# Altium footprint library Package_DIP.PcbLib: 236 footprints (part 7 of 15)
Each footprint in its own frame and in the unit in brackets; x right, y up, seen from the top. Pads: shape width x height; smd on the part's side, far side on the other; paste and mask are expansions set on the pad; w line width, h text height; cw(c..) or ccw(c..) is an arc to the next point about the centre after c.
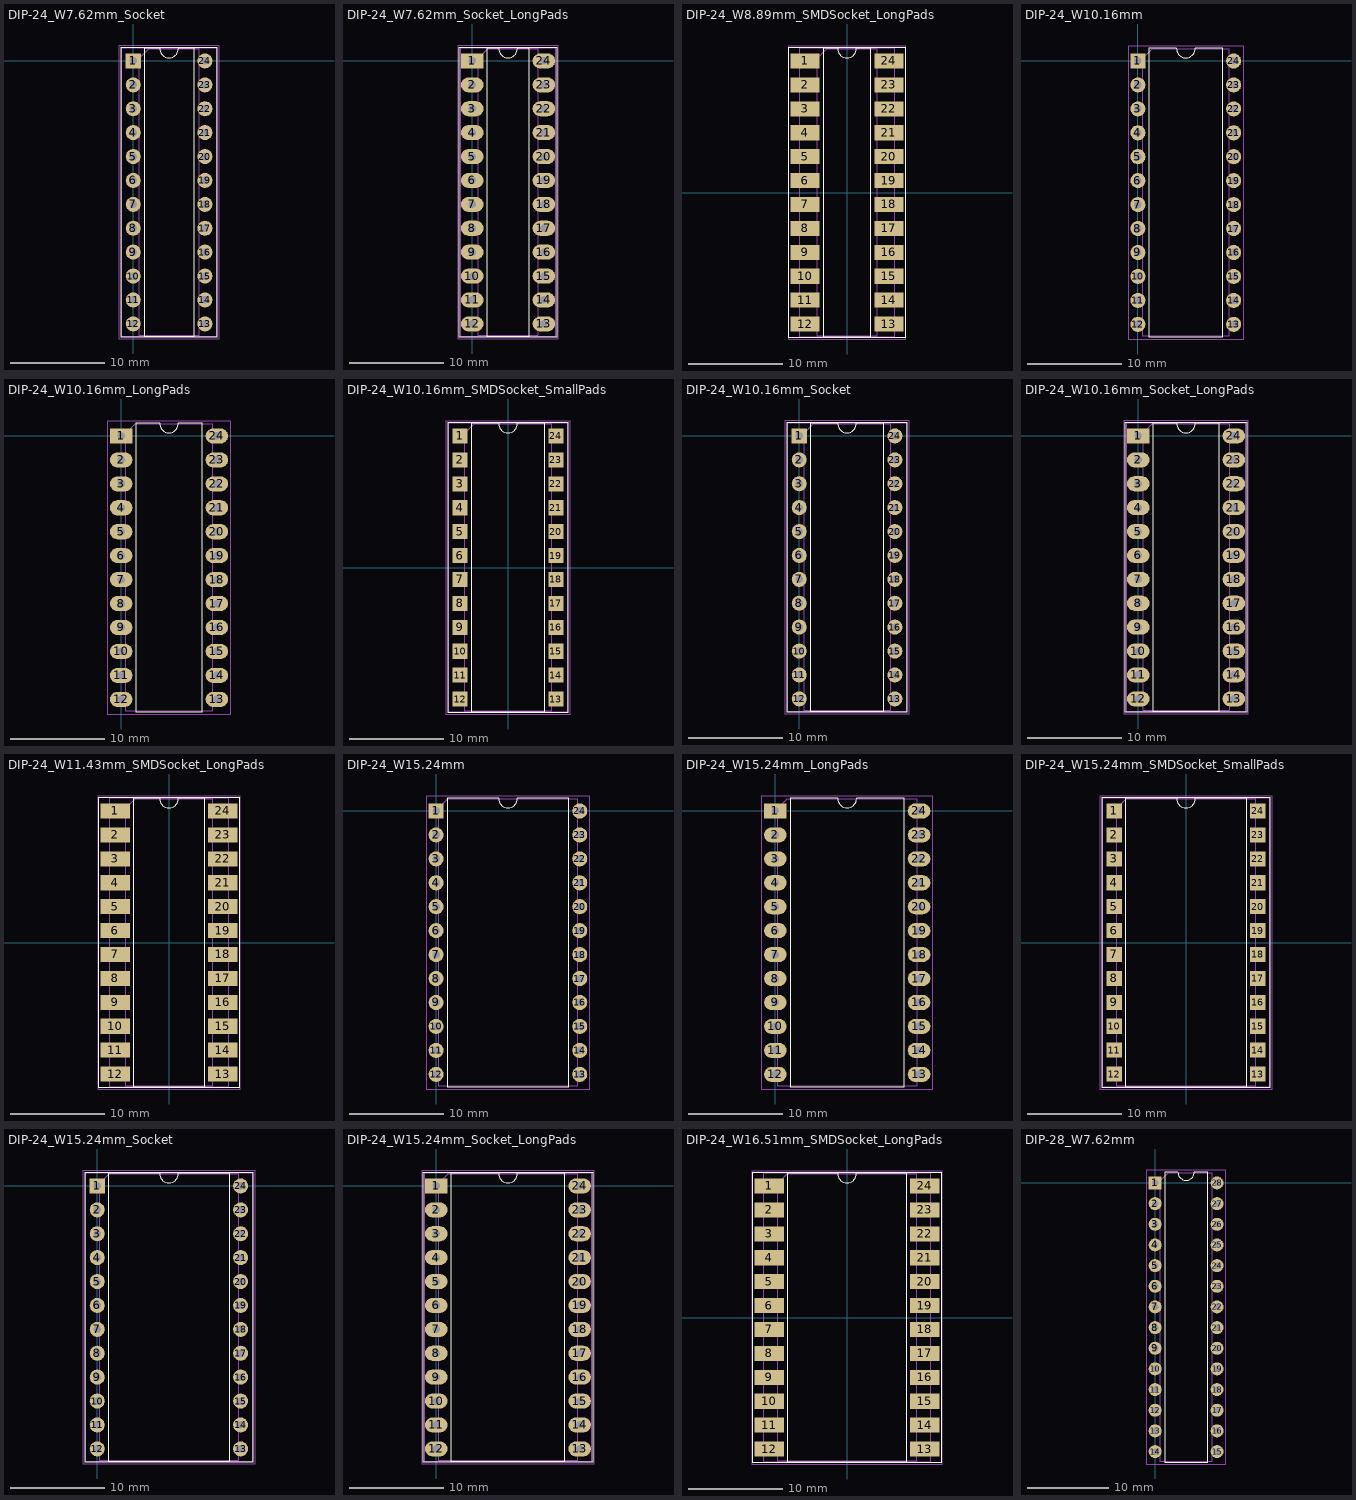
[diagram p6: the footprints below, top view; thin cyan lines are the x and y axes]

## DIP-24_W7.62mm_Socket [mm]
pads (24):
  rect 1.6x1.6 hole 0.8: 1(0,0)
  rrect100% 1.6x1.6 hole 0.8: 2(0,-2.54) 3(0,-5.08) 4(0,-7.62) 5(0,-10.16) 6(0,-12.7) 7(0,-15.24) 8(0,-17.78) 9(0,-20.32) 10(0,-22.86) 11(0,-25.4) 12(0,-27.94) 13(7.62,-27.94) 14(7.62,-25.4) 15(7.62,-22.86) 16(7.62,-20.32) 17(7.62,-17.78) 18(7.62,-15.24) 19(7.62,-12.7) 20(7.62,-10.16) 21(7.62,-7.62) 22(7.62,-5.08) 23(7.62,-2.54) 24(7.62,0)
F.SilkS:
  lines w0.12: -1.33,-29.33 -1.33,1.39 8.95,1.39 8.95,-29.33 -1.33,-29.33 ; 1.16,-29.27 1.16,1.33 2.81,1.33 ccw(c3.81,1.33) 4.81,1.33 6.46,1.33 6.46,-29.27 1.16,-29.27
F.CrtYd:
  lines w0.05: -1.55,-29.55 -1.55,1.6 9.15,1.6 9.15,-29.55 -1.55,-29.55
F.Fab:
  lines w0.1: -1.27,-29.27 8.89,-29.27 8.89,1.33 -1.27,1.33 -1.27,-29.27 ; 0.635,-29.21 0.635,0.27 1.635,1.27 6.985,1.27 6.985,-29.21 0.635,-29.21
  text "'.Designator'" at -0.237,-14.81 h1

## DIP-24_W7.62mm_Socket_LongPads [mm]
pads (24):
  rect 2.4x1.6 hole 0.8: 1(0,0)
  rrect100% 2.4x1.6 hole 0.8: 2(0,-2.54) 3(0,-5.08) 4(0,-7.62) 5(0,-10.16) 6(0,-12.7) 7(0,-15.24) 8(0,-17.78) 9(0,-20.32) 10(0,-22.86) 11(0,-25.4) 12(0,-27.94) 13(7.62,-27.94) 14(7.62,-25.4) 15(7.62,-22.86) 16(7.62,-20.32) 17(7.62,-17.78) 18(7.62,-15.24) 19(7.62,-12.7) 20(7.62,-10.16) 21(7.62,-7.62) 22(7.62,-5.08) 23(7.62,-2.54) 24(7.62,0)
F.SilkS:
  lines w0.12: -1.44,-29.33 9.06,-29.33 9.06,1.39 -1.44,1.39 -1.44,-29.33 ; 1.56,-29.27 6.06,-29.27 6.06,1.33 4.81,1.33 cw(c3.81,1.33) 2.81,1.33 1.56,1.33 1.56,-29.27
F.CrtYd:
  lines w0.05: -1.55,-29.55 -1.55,1.6 9.15,1.6 9.15,-29.55 -1.55,-29.55
F.Fab:
  lines w0.1: -1.27,-29.27 -1.27,1.33 8.89,1.33 8.89,-29.27 -1.27,-29.27 ; 0.635,-29.21 0.635,0.27 1.635,1.27 6.985,1.27 6.985,-29.21 0.635,-29.21
  text "'.Designator'" at -0.237,-14.81 h1

## DIP-24_W8.89mm_SMDSocket_LongPads [mm]
pads (24):
  rect 3.1x1.6 smd: 1(-4.445,13.97) 2(-4.445,11.43) 3(-4.445,8.89) 4(-4.445,6.35) 5(-4.445,3.81) 6(-4.445,1.27) 7(-4.445,-1.27) 8(-4.445,-3.81) 9(-4.445,-6.35) 10(-4.445,-8.89) 11(-4.445,-11.43) 12(-4.445,-13.97) 13(4.445,-13.97) 14(4.445,-11.43) 15(4.445,-8.89) 16(4.445,-6.35) 17(4.445,-3.81) 18(4.445,-1.27) 19(4.445,1.27) 20(4.445,3.81) 21(4.445,6.35) 22(4.445,8.89) 23(4.445,11.43) 24(4.445,13.97)
F.SilkS:
  lines w0.12: -6.235,-15.36 6.235,-15.36 6.235,15.36 -6.235,15.36 -6.235,-15.36 ; -2.535,-15.3 -2.535,15.3 -1,15.3 ccw(c0,15.3) 1,15.3 2.535,15.3 2.535,-15.3 -2.535,-15.3
F.CrtYd:
  lines w0.05: -6.25,-15.55 -6.25,15.55 6.25,15.55 6.25,-15.55 -6.25,-15.55
F.Fab:
  lines w0.1: -5.08,-15.3 5.08,-15.3 5.08,15.3 -5.08,15.3 -5.08,-15.3 ; -3.175,-15.24 -3.175,14.24 -2.175,15.24 3.175,15.24 3.175,-15.24 -3.175,-15.24
  text "'.Designator'" at -4.047,-0.84 h1

## DIP-24_W10.16mm [mm]
pads (24):
  rect 1.6x1.6 hole 0.8: 1(0,0)
  rrect100% 1.6x1.6 hole 0.8: 2(0,-2.54) 3(0,-5.08) 4(0,-7.62) 5(0,-10.16) 6(0,-12.7) 7(0,-15.24) 8(0,-17.78) 9(0,-20.32) 10(0,-22.86) 11(0,-25.4) 12(0,-27.94) 13(10.16,-27.94) 14(10.16,-25.4) 15(10.16,-22.86) 16(10.16,-20.32) 17(10.16,-17.78) 18(10.16,-15.24) 19(10.16,-12.7) 20(10.16,-10.16) 21(10.16,-7.62) 22(10.16,-5.08) 23(10.16,-2.54) 24(10.16,0)
F.SilkS:
  lines w0.12: 1.16,-29.27 9,-29.27 9,1.33 6.08,1.33 cw(c5.08,1.33) 4.08,1.33 1.16,1.33 1.16,-29.27
F.CrtYd:
  lines w0.05: -1.05,-29.5 -1.05,1.55 11.25,1.55 11.25,-29.5 -1.05,-29.5
F.Fab:
  lines w0.1: 0.51,-29.21 9.65,-29.21 9.65,1.27 1.51,1.27 0.51,0.27 0.51,-29.21
  text "'.Designator'" at 1.033,-14.81 h1

## DIP-24_W10.16mm_LongPads [mm]
pads (24):
  rect 2.4x1.6 hole 0.8: 1(0,0)
  rrect100% 2.4x1.6 hole 0.8: 2(0,-2.54) 3(0,-5.08) 4(0,-7.62) 5(0,-10.16) 6(0,-12.7) 7(0,-15.24) 8(0,-17.78) 9(0,-20.32) 10(0,-22.86) 11(0,-25.4) 12(0,-27.94) 13(10.16,-27.94) 14(10.16,-25.4) 15(10.16,-22.86) 16(10.16,-20.32) 17(10.16,-17.78) 18(10.16,-15.24) 19(10.16,-12.7) 20(10.16,-10.16) 21(10.16,-7.62) 22(10.16,-5.08) 23(10.16,-2.54) 24(10.16,0)
F.SilkS:
  lines w0.12: 1.56,-29.27 8.6,-29.27 8.6,1.33 6.08,1.33 cw(c5.08,1.33) 4.08,1.33 1.56,1.33 1.56,-29.27
F.CrtYd:
  lines w0.05: -1.5,-29.5 -1.5,1.55 11.65,1.55 11.65,-29.5 -1.5,-29.5
F.Fab:
  lines w0.1: 0.51,-29.21 9.65,-29.21 9.65,1.27 1.51,1.27 0.51,0.27 0.51,-29.21
  text "'.Designator'" at 1.033,-14.81 h1

## DIP-24_W10.16mm_SMDSocket_SmallPads [mm]
pads (24):
  rect 1.6x1.6 smd: 1(-5.08,13.97) 2(-5.08,11.43) 3(-5.08,8.89) 4(-5.08,6.35) 5(-5.08,3.81) 6(-5.08,1.27) 7(-5.08,-1.27) 8(-5.08,-3.81) 9(-5.08,-6.35) 10(-5.08,-8.89) 11(-5.08,-11.43) 12(-5.08,-13.97) 13(5.08,-13.97) 14(5.08,-11.43) 15(5.08,-8.89) 16(5.08,-6.35) 17(5.08,-3.81) 18(5.08,-1.27) 19(5.08,1.27) 20(5.08,3.81) 21(5.08,6.35) 22(5.08,8.89) 23(5.08,11.43) 24(5.08,13.97)
F.SilkS:
  lines w0.12: -6.41,-15.36 -6.41,15.36 6.41,15.36 6.41,-15.36 -6.41,-15.36 ; -3.92,-15.3 -3.92,15.3 -1,15.3 ccw(c0,15.3) 1,15.3 3.92,15.3 3.92,-15.3 -3.92,-15.3
F.CrtYd:
  lines w0.05: -6.6,-15.55 6.6,-15.55 6.6,15.55 -6.6,15.55 -6.6,-15.55
F.Fab:
  lines w0.1: -6.35,-15.3 -6.35,15.3 6.35,15.3 6.35,-15.3 -6.35,-15.3 ; -4.57,-15.24 -4.57,14.24 -3.57,15.24 4.57,15.24 4.57,-15.24 -4.57,-15.24
  text "'.Designator'" at -4.047,-0.84 h1

## DIP-24_W10.16mm_Socket [mm]
pads (24):
  rect 1.6x1.6 hole 0.8: 1(0,0)
  rrect100% 1.6x1.6 hole 0.8: 2(0,-2.54) 3(0,-5.08) 4(0,-7.62) 5(0,-10.16) 6(0,-12.7) 7(0,-15.24) 8(0,-17.78) 9(0,-20.32) 10(0,-22.86) 11(0,-25.4) 12(0,-27.94) 13(10.16,-27.94) 14(10.16,-25.4) 15(10.16,-22.86) 16(10.16,-20.32) 17(10.16,-17.78) 18(10.16,-15.24) 19(10.16,-12.7) 20(10.16,-10.16) 21(10.16,-7.62) 22(10.16,-5.08) 23(10.16,-2.54) 24(10.16,0)
F.SilkS:
  lines w0.12: -1.33,-29.33 11.49,-29.33 11.49,1.39 -1.33,1.39 -1.33,-29.33 ; 1.16,-29.27 1.16,1.33 4.08,1.33 ccw(c5.08,1.33) 6.08,1.33 9,1.33 9,-29.27 1.16,-29.27
F.CrtYd:
  lines w0.05: -1.55,-29.55 11.7,-29.55 11.7,1.6 -1.55,1.6 -1.55,-29.55
F.Fab:
  lines w0.1: -1.27,-29.27 11.43,-29.27 11.43,1.33 -1.27,1.33 -1.27,-29.27 ; 0.51,-29.21 9.65,-29.21 9.65,1.27 1.51,1.27 0.51,0.27 0.51,-29.21
  text "'.Designator'" at 1.033,-14.81 h1

## DIP-24_W10.16mm_Socket_LongPads [mm]
pads (24):
  rect 2.4x1.6 hole 0.8: 1(0,0)
  rrect100% 2.4x1.6 hole 0.8: 2(0,-2.54) 3(0,-5.08) 4(0,-7.62) 5(0,-10.16) 6(0,-12.7) 7(0,-15.24) 8(0,-17.78) 9(0,-20.32) 10(0,-22.86) 11(0,-25.4) 12(0,-27.94) 13(10.16,-27.94) 14(10.16,-25.4) 15(10.16,-22.86) 16(10.16,-20.32) 17(10.16,-17.78) 18(10.16,-15.24) 19(10.16,-12.7) 20(10.16,-10.16) 21(10.16,-7.62) 22(10.16,-5.08) 23(10.16,-2.54) 24(10.16,0)
F.SilkS:
  lines w0.12: -1.44,-29.33 11.6,-29.33 11.6,1.39 -1.44,1.39 -1.44,-29.33 ; 1.56,-29.27 8.6,-29.27 8.6,1.33 6.08,1.33 cw(c5.08,1.33) 4.08,1.33 1.56,1.33 1.56,-29.27
F.CrtYd:
  lines w0.05: -1.55,-29.55 11.7,-29.55 11.7,1.6 -1.55,1.6 -1.55,-29.55
F.Fab:
  lines w0.1: -1.27,-29.27 11.43,-29.27 11.43,1.33 -1.27,1.33 -1.27,-29.27 ; 0.51,-29.21 9.65,-29.21 9.65,1.27 1.51,1.27 0.51,0.27 0.51,-29.21
  text "'.Designator'" at 1.033,-14.81 h1

## DIP-24_W11.43mm_SMDSocket_LongPads [mm]
pads (24):
  rect 3.1x1.6 smd: 1(-5.715,13.97) 2(-5.715,11.43) 3(-5.715,8.89) 4(-5.715,6.35) 5(-5.715,3.81) 6(-5.715,1.27) 7(-5.715,-1.27) 8(-5.715,-3.81) 9(-5.715,-6.35) 10(-5.715,-8.89) 11(-5.715,-11.43) 12(-5.715,-13.97) 13(5.715,-13.97) 14(5.715,-11.43) 15(5.715,-8.89) 16(5.715,-6.35) 17(5.715,-3.81) 18(5.715,-1.27) 19(5.715,1.27) 20(5.715,3.81) 21(5.715,6.35) 22(5.715,8.89) 23(5.715,11.43) 24(5.715,13.97)
F.SilkS:
  lines w0.12: -7.505,-15.36 -7.505,15.36 7.505,15.36 7.505,-15.36 -7.505,-15.36 ; -3.805,-15.3 3.805,-15.3 3.805,15.3 1,15.3 cw(c0,15.3) -1,15.3 -3.805,15.3 -3.805,-15.3
F.CrtYd:
  lines w0.05: -7.55,-15.55 -7.55,15.55 7.55,15.55 7.55,-15.55 -7.55,-15.55
F.Fab:
  lines w0.1: -6.35,-15.3 -6.35,15.3 6.35,15.3 6.35,-15.3 -6.35,-15.3 ; -4.57,-15.24 -4.57,14.24 -3.57,15.24 4.57,15.24 4.57,-15.24 -4.57,-15.24
  text "'.Designator'" at -4.047,-0.84 h1

## DIP-24_W15.24mm [mm]
pads (24):
  rect 1.6x1.6 hole 0.8: 1(0,0)
  rrect100% 1.6x1.6 hole 0.8: 2(0,-2.54) 3(0,-5.08) 4(0,-7.62) 5(0,-10.16) 6(0,-12.7) 7(0,-15.24) 8(0,-17.78) 9(0,-20.32) 10(0,-22.86) 11(0,-25.4) 12(0,-27.94) 13(15.24,-27.94) 14(15.24,-25.4) 15(15.24,-22.86) 16(15.24,-20.32) 17(15.24,-17.78) 18(15.24,-15.24) 19(15.24,-12.7) 20(15.24,-10.16) 21(15.24,-7.62) 22(15.24,-5.08) 23(15.24,-2.54) 24(15.24,0)
F.SilkS:
  lines w0.12: 1.16,-29.27 14.08,-29.27 14.08,1.33 8.62,1.33 cw(c7.62,1.33) 6.62,1.33 1.16,1.33 1.16,-29.27
F.CrtYd:
  lines w0.05: -1.05,-29.5 -1.05,1.55 16.3,1.55 16.3,-29.5 -1.05,-29.5
F.Fab:
  lines w0.1: 0.255,-29.21 14.985,-29.21 14.985,1.27 1.255,1.27 0.255,0.27 0.255,-29.21
  text "'.Designator'" at 3.573,-14.81 h1

## DIP-24_W15.24mm_LongPads [mm]
pads (24):
  rect 2.4x1.6 hole 0.8: 1(0,0)
  rrect100% 2.4x1.6 hole 0.8: 2(0,-2.54) 3(0,-5.08) 4(0,-7.62) 5(0,-10.16) 6(0,-12.7) 7(0,-15.24) 8(0,-17.78) 9(0,-20.32) 10(0,-22.86) 11(0,-25.4) 12(0,-27.94) 13(15.24,-27.94) 14(15.24,-25.4) 15(15.24,-22.86) 16(15.24,-20.32) 17(15.24,-17.78) 18(15.24,-15.24) 19(15.24,-12.7) 20(15.24,-10.16) 21(15.24,-7.62) 22(15.24,-5.08) 23(15.24,-2.54) 24(15.24,0)
F.SilkS:
  lines w0.12: 1.56,-29.27 1.56,1.33 6.62,1.33 ccw(c7.62,1.33) 8.62,1.33 13.68,1.33 13.68,-29.27 1.56,-29.27
F.CrtYd:
  lines w0.05: -1.5,-29.5 16.7,-29.5 16.7,1.55 -1.5,1.55 -1.5,-29.5
F.Fab:
  lines w0.1: 0.255,-29.21 0.255,0.27 1.255,1.27 14.985,1.27 14.985,-29.21 0.255,-29.21
  text "'.Designator'" at 3.573,-14.81 h1

## DIP-24_W15.24mm_SMDSocket_SmallPads [mm]
pads (24):
  rect 1.6x1.6 smd: 1(-7.62,13.97) 2(-7.62,11.43) 3(-7.62,8.89) 4(-7.62,6.35) 5(-7.62,3.81) 6(-7.62,1.27) 7(-7.62,-1.27) 8(-7.62,-3.81) 9(-7.62,-6.35) 10(-7.62,-8.89) 11(-7.62,-11.43) 12(-7.62,-13.97) 13(7.62,-13.97) 14(7.62,-11.43) 15(7.62,-8.89) 16(7.62,-6.35) 17(7.62,-3.81) 18(7.62,-1.27) 19(7.62,1.27) 20(7.62,3.81) 21(7.62,6.35) 22(7.62,8.89) 23(7.62,11.43) 24(7.62,13.97)
F.SilkS:
  lines w0.12: -8.95,-15.36 8.95,-15.36 8.95,15.36 -8.95,15.36 -8.95,-15.36 ; -6.46,-15.3 6.46,-15.3 6.46,15.3 1,15.3 cw(c0,15.3) -1,15.3 -6.46,15.3 -6.46,-15.3
F.CrtYd:
  lines w0.05: -9.15,-15.55 9.15,-15.55 9.15,15.55 -9.15,15.55 -9.15,-15.55
F.Fab:
  lines w0.1: -8.89,-15.3 -8.89,15.3 8.89,15.3 8.89,-15.3 -8.89,-15.3 ; -7.365,-15.24 -7.365,14.24 -6.365,15.24 7.365,15.24 7.365,-15.24 -7.365,-15.24
  text "'.Designator'" at -4.047,-0.84 h1

## DIP-24_W15.24mm_Socket [mm]
pads (24):
  rect 1.6x1.6 hole 0.8: 1(0,0)
  rrect100% 1.6x1.6 hole 0.8: 2(0,-2.54) 3(0,-5.08) 4(0,-7.62) 5(0,-10.16) 6(0,-12.7) 7(0,-15.24) 8(0,-17.78) 9(0,-20.32) 10(0,-22.86) 11(0,-25.4) 12(0,-27.94) 13(15.24,-27.94) 14(15.24,-25.4) 15(15.24,-22.86) 16(15.24,-20.32) 17(15.24,-17.78) 18(15.24,-15.24) 19(15.24,-12.7) 20(15.24,-10.16) 21(15.24,-7.62) 22(15.24,-5.08) 23(15.24,-2.54) 24(15.24,0)
F.SilkS:
  lines w0.12: -1.33,-29.33 -1.33,1.39 16.57,1.39 16.57,-29.33 -1.33,-29.33 ; 1.16,-29.27 1.16,1.33 6.62,1.33 ccw(c7.62,1.33) 8.62,1.33 14.08,1.33 14.08,-29.27 1.16,-29.27
F.CrtYd:
  lines w0.05: -1.55,-29.55 -1.55,1.6 16.8,1.6 16.8,-29.55 -1.55,-29.55
F.Fab:
  lines w0.1: -1.27,-29.27 16.51,-29.27 16.51,1.33 -1.27,1.33 -1.27,-29.27 ; 0.255,-29.21 0.255,0.27 1.255,1.27 14.985,1.27 14.985,-29.21 0.255,-29.21
  text "'.Designator'" at 3.573,-14.81 h1

## DIP-24_W15.24mm_Socket_LongPads [mm]
pads (24):
  rect 2.4x1.6 hole 0.8: 1(0,0)
  rrect100% 2.4x1.6 hole 0.8: 2(0,-2.54) 3(0,-5.08) 4(0,-7.62) 5(0,-10.16) 6(0,-12.7) 7(0,-15.24) 8(0,-17.78) 9(0,-20.32) 10(0,-22.86) 11(0,-25.4) 12(0,-27.94) 13(15.24,-27.94) 14(15.24,-25.4) 15(15.24,-22.86) 16(15.24,-20.32) 17(15.24,-17.78) 18(15.24,-15.24) 19(15.24,-12.7) 20(15.24,-10.16) 21(15.24,-7.62) 22(15.24,-5.08) 23(15.24,-2.54) 24(15.24,0)
F.SilkS:
  lines w0.12: -1.44,-29.33 -1.44,1.39 16.68,1.39 16.68,-29.33 -1.44,-29.33 ; 1.56,-29.27 13.68,-29.27 13.68,1.33 8.62,1.33 cw(c7.62,1.33) 6.62,1.33 1.56,1.33 1.56,-29.27
F.CrtYd:
  lines w0.05: -1.55,-29.55 16.8,-29.55 16.8,1.6 -1.55,1.6 -1.55,-29.55
F.Fab:
  lines w0.1: -1.27,-29.27 16.51,-29.27 16.51,1.33 -1.27,1.33 -1.27,-29.27 ; 0.255,-29.21 0.255,0.27 1.255,1.27 14.985,1.27 14.985,-29.21 0.255,-29.21
  text "'.Designator'" at 3.573,-14.81 h1

## DIP-24_W16.51mm_SMDSocket_LongPads [mm]
pads (24):
  rect 3.1x1.6 smd: 1(-8.255,13.97) 2(-8.255,11.43) 3(-8.255,8.89) 4(-8.255,6.35) 5(-8.255,3.81) 6(-8.255,1.27) 7(-8.255,-1.27) 8(-8.255,-3.81) 9(-8.255,-6.35) 10(-8.255,-8.89) 11(-8.255,-11.43) 12(-8.255,-13.97) 13(8.255,-13.97) 14(8.255,-11.43) 15(8.255,-8.89) 16(8.255,-6.35) 17(8.255,-3.81) 18(8.255,-1.27) 19(8.255,1.27) 20(8.255,3.81) 21(8.255,6.35) 22(8.255,8.89) 23(8.255,11.43) 24(8.255,13.97)
F.SilkS:
  lines w0.12: -10.045,-15.36 10.045,-15.36 10.045,15.36 -10.045,15.36 -10.045,-15.36 ; -6.345,-15.3 -6.345,15.3 -1,15.3 ccw(c0,15.3) 1,15.3 6.345,15.3 6.345,-15.3 -6.345,-15.3
F.CrtYd:
  lines w0.05: -10.1,-15.55 10.1,-15.55 10.1,15.55 -10.1,15.55 -10.1,-15.55
F.Fab:
  lines w0.1: -8.89,-15.3 -8.89,15.3 8.89,15.3 8.89,-15.3 -8.89,-15.3 ; -7.365,-15.24 7.365,-15.24 7.365,15.24 -6.365,15.24 -7.365,14.24 -7.365,-15.24
  text "'.Designator'" at -4.047,-0.84 h1

## DIP-28_W7.62mm [mm]
pads (28):
  rect 1.6x1.6 hole 0.8: 1(0,0)
  rrect100% 1.6x1.6 hole 0.8: 2(0,-2.54) 3(0,-5.08) 4(0,-7.62) 5(0,-10.16) 6(0,-12.7) 7(0,-15.24) 8(0,-17.78) 9(0,-20.32) 10(0,-22.86) 11(0,-25.4) 12(0,-27.94) 13(0,-30.48) 14(0,-33.02) 15(7.62,-33.02) 16(7.62,-30.48) 17(7.62,-27.94) 18(7.62,-25.4) 19(7.62,-22.86) 20(7.62,-20.32) 21(7.62,-17.78) 22(7.62,-15.24) 23(7.62,-12.7) 24(7.62,-10.16) 25(7.62,-7.62) 26(7.62,-5.08) 27(7.62,-2.54) 28(7.62,0)
F.SilkS:
  lines w0.12: 1.16,-34.35 1.16,1.33 2.81,1.33 ccw(c3.81,1.33) 4.81,1.33 6.46,1.33 6.46,-34.35 1.16,-34.35
F.CrtYd:
  lines w0.05: -1.1,-34.55 8.7,-34.55 8.7,1.55 -1.1,1.55 -1.1,-34.55
F.Fab:
  lines w0.1: 0.635,-34.29 0.635,0.27 1.635,1.27 6.985,1.27 6.985,-34.29 0.635,-34.29
  text "'.Designator'" at -0.237,-17.35 h1